# Altium footprint library Connectors.PcbLib: 69 footprints (part 3 of 5)
Each footprint in its own frame and in the unit in brackets; x right, y up, seen from the top. Pads: shape width x height; smd on the part's side, far side on the other; paste and mask are expansions set on the pad; w line width, h text height; cw(c..) or ccw(c..) is an arc to the next point about the centre after c.
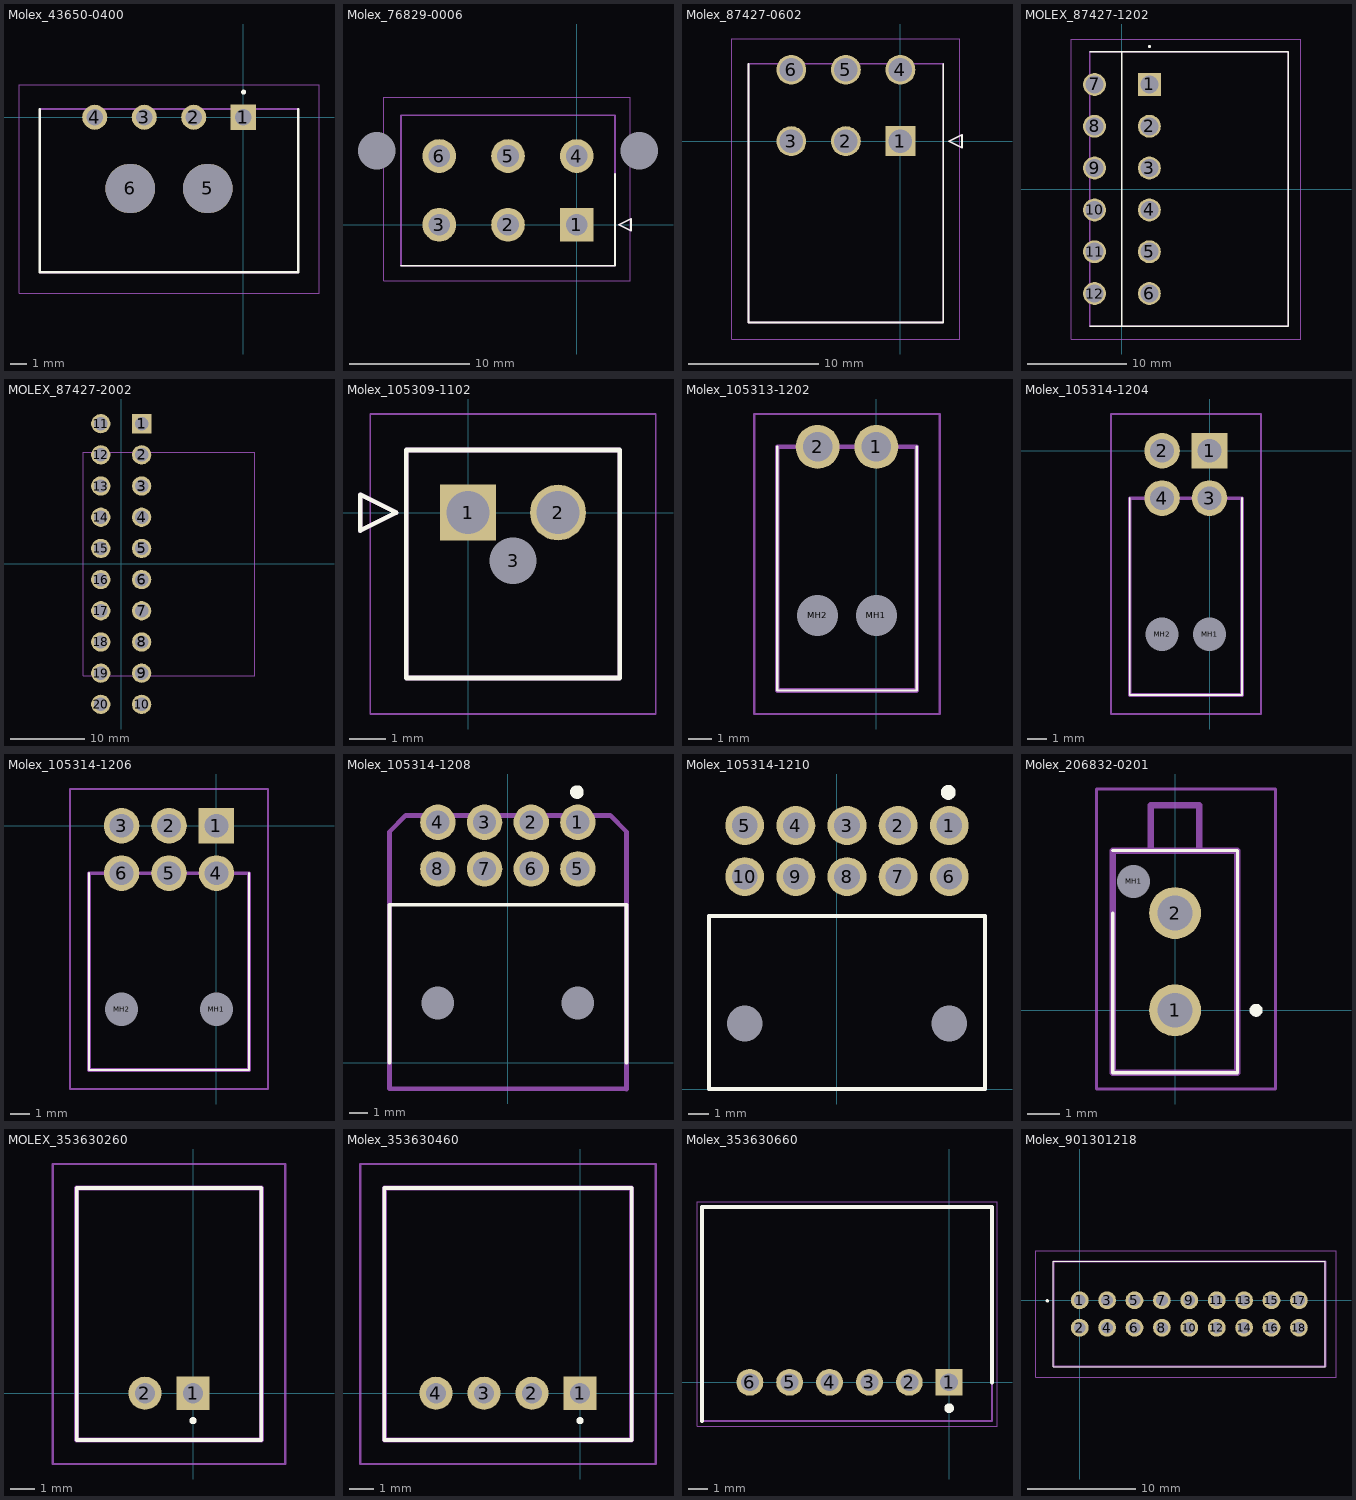
[diagram p2: the footprints below, top view; thin cyan lines are the x and y axes]

## Molex_43650-0400 [mm]
pads (6):
  rect 1.52x1.52 hole 1.02: 1(0,0)
  round 1.52 hole 1.02: 2(-3,0) 3(-6,0) 4(-9,0)
  round 3 hole 3 unplated: 5(-2.15,-4.32) 6(-6.85,-4.32)
Top Overlay:
  lines w0.15: -12.325,0.49 -12.325,-9.41 3.325,-9.41 3.325,0.49
  lines w0.2: 0.025,1.474 ccw(c0.025,1.524) 0.025,1.574 ccw(c0.025,1.524) 0.025,1.474
Top 3D Body (Mech13):
  lines w0.127: -12.325,-9.41 3.325,-9.41 3.325,0.49 -12.325,0.49 -12.325,-9.41
Mechanical 15:
  lines w0.05: -13.595,-10.68 4.595,-10.68 4.595,1.979 -13.595,1.979 -13.595,-10.68
3D body "43650-0400.stp": height 5.55, standoff -3.36, extent -12.375,-9.01 3.275,0.89

## Molex_76829-0006 [mm]
pads (8):
  round 0 hole 3.1 unplated: 0(-16.59,6.15) 0(5.19,6.15)
  rect 2.8x2.8 hole 1.8: 1(0,0)
  round 2.8 hole 1.8: 2(-5.7,0) 3(-11.4,0) 4(0,5.7) 5(-5.7,5.7) 6(-11.4,5.7)
Top Overlay:
  lines w0.127: -14.575,-3.39 3.175,-3.39 3.175,4.22 ; 3.5,0 4.5,-0.5 4.5,0.5 3.5,0
Top 3D Body (Mech13):
  lines w0.127: -14.575,-3.39 3.175,-3.39 3.175,9.09 -14.575,9.09 -14.575,-3.39 ; 3.5,0 4.5,-0.5 4.5,0.5 3.5,0
Mechanical 15:
  lines w0.05: -15.999,-4.66 4.445,-4.66 4.445,10.589 -15.999,10.589 -15.999,-4.66
3D body "768290006.stp": height 14.83, standoff -3.75, extent -18.141,-3.199 6.651,10.835

## Molex_87427-0602 [mm]
pads (6):
  rect 2.3x2.3 hole 1.8: 1(0,0)
  round 2.3 hole 1.8: 2(-4.2,0) 3(-8.4,0) 4(0,5.5) 5(-4.2,5.5) 6(-8.4,5.5)
Top Overlay:
  lines w0.127: -11.7,5.968 -11.7,-13.968 3.3,-13.968 3.3,5.968 ; 3.75,0 4.75,0.5 4.75,-0.5 3.75,0
Top 3D Body (Mech13):
  lines w0.127: -11.7,-13.968 -11.7,5.968 3.3,5.968 3.3,-13.968 -11.7,-13.968 ; 3.75,0 4.75,0.5 4.75,-0.5 3.75,0
Mechanical 15:
  lines w0.05: -12.97,-15.238 -12.97,7.869 4.57,7.869 4.57,-15.238 -12.97,-15.238
3D body "87427-0602.stp": height 11.4, standoff -3.3, extent -11.6,-14 3.4,5.935

## MOLEX_87427-1202 [mm]
pads (12):
  rect 2.3x2.3 hole 1.8: 1(2.75,10.5)
  round 2.3 hole 1.8: 2(2.75,6.3) 3(2.75,2.1) 4(2.75,-2.1) 5(2.75,-6.3) 6(2.75,-10.5) 7(-2.75,10.5) 8(-2.75,6.3) 9(-2.75,2.1) 10(-2.75,-2.1) 11(-2.75,-6.3) 12(-2.75,-10.5)
Top Overlay:
  lines w0.15: -3.218,-13.8 16.718,-13.8 16.718,13.8 -3.218,13.8 ; 0,-13.75 0,13.75
  lines w0.2: 2.775,14.26 ccw(c2.775,14.31) 2.775,14.36 ccw(c2.775,14.31) 2.775,14.26
Top 3D Body (Mech13):
  lines w0.127: -3.218,-13.8 16.718,-13.8 16.718,13.8 -3.218,13.8 -3.218,-13.8
Mechanical 15:
  lines w0.05: -5.119,-15.07 17.988,-15.07 17.988,15.07 -5.119,15.07 -5.119,-15.07
3D body "87427-1202.stp": height 11.4, standoff -3.3, extent -3.415,-13.84 16.52,13.76

## MOLEX_87427-2002 [mm]
pads (20):
  rect 2.6x2.6 hole 1.8: 1(2.75,18.9)
  round 2.6 hole 1.8: 2(2.75,14.7) 3(2.75,10.5) 4(2.75,6.3) 5(2.75,2.1) 6(2.75,-2.1) 7(2.75,-6.3) 8(2.75,-10.5) 9(2.75,-14.7) 10(2.75,-18.9) 11(-2.75,18.9) 12(-2.75,14.7) 13(-2.75,10.5) 14(-2.75,6.3) 15(-2.75,2.1) 16(-2.75,-2.1) 17(-2.75,-6.3) 18(-2.75,-10.5) 19(-2.75,-14.7) 20(-2.75,-18.9)
Top Overlay:
  lines w0.2: 2.775,14.26 cw(c2.775,14.31) 2.775,14.36 cw(c2.775,14.31) 2.775,14.26
Mechanical 15:
  lines w0.05: -5.119,-15.07 -5.119,15.07 17.988,15.07 17.988,-15.07 -5.119,-15.07
3D body "874272002.stp": height 11.4, standoff -3.3, extent -3.415,-22.2 16.52,22.2

## Molex_105309-1102 [mm]
pads (3):
  rect 1.55x1.55 hole 1.2: 1(0,0)
  round 1.55 hole 1.2: 2(2.5,0)
  round 0.65 hole 1.3 unplated: 3(1.25,-1.34)
Top Overlay:
  lines w0.127: -3,-0.5 -2,0 -3,0.5 -3,-0.5 ; -1.72,-4.6 -1.72,1.74 4.22,1.74 4.22,-4.6 -1.72,-4.6
Top 3D Body (Mech13):
  lines w0.127: -3,-0.5 -2,0 -3,0.5 -3,-0.5 ; -1.72,-4.6 -1.72,1.74 4.22,1.74 4.22,-4.6 -1.72,-4.6
Mechanical 15:
  lines w0.05: -2.72,-5.6 -2.72,2.74 5.22,2.74 5.22,-5.6 -2.72,-5.6
3D body "1053091102.stp": height 10.45, standoff -3.26, extent -1.69,-4.6 4.25,1.74

## Molex_105313-1202 [mm]
pads (4):
  round 1.875 hole 1.25: 1(0,-2.5) 2(-2.5,-2.5)
  round 0.875 hole 1.75 unplated: MH1(0,-9.68) MH2(-2.5,-9.68)
Top Overlay:
  lines w0.1: -4.22,-2.5 -4.22,-12.88 1.72,-12.88 ; 1.72,-12.88 1.72,-2.5 1.72,-12.88
Top 3D Body (Mech13):
  lines w0.2: -4.22,-12.88 -4.22,-2.5 ; -4.2,-12.88 1.72,-12.88 1.72,-2.5 -4.2,-2.5
Mechanical 15:
  lines w0.1: -5.2,-13.88 2.7,-13.88 2.7,-1.1 -5.2,-1.1 -5.2,-13.88
3D body "1053131202.stp": height 6.65, standoff -3.19, extent -4.22,-14.29 1.72,-2.133

## Molex_105314-1204 [mm]
pads (6):
  rect 1.875x1.875 hole 1.25: 1(0,0)
  round 1.875 hole 1.25: 2(-2.5,0) 3(0,-2.5) 4(-2.5,-2.5)
  round 0.875 hole 1.75 unplated: MH1(0,-9.68) MH2(-2.5,-9.68)
Top Overlay:
  lines w0.1: -4.204,-2.5 -4.204,-12.88 1.72,-12.88 ; 1.72,-12.88 1.72,-2.5 1.72,-12.88
Top 3D Body (Mech13):
  lines w0.2: -4.204,-12.88 1.72,-12.88 1.72,-2.5 -4.204,-2.5 -4.204,-12.88
Mechanical 15:
  lines w0.1: -5.2,-13.88 2.72,-13.88 2.72,1.938 -5.2,1.938 -5.2,-13.88
3D body "1053141204.stp": height 9.2, standoff -3.14, extent -4.22,-14.39 1.72,0.268

## Molex_105314-1206 [mm]
pads (8):
  rect 1.875x1.875 hole 1.25: 1(0,0)
  round 1.875 hole 1.25: 2(-2.5,0) 3(-5,0) 4(0,-2.5) 5(-2.5,-2.5) 6(-5,-2.5)
  round 0.875 hole 1.75 unplated: MH1(0,-9.68) MH2(-5,-9.68)
Top Overlay:
  lines w0.1: -6.72,-12.88 1.72,-12.88 ; -6.72,-12.88 1.72,-12.88 ; -6.72,-12.88 -6.72,-2.5 -6.72,-12.88 ; 1.72,-12.88 1.72,-2.5 1.72,-12.88
Top 3D Body (Mech13):
  lines w0.2: -6.72,-12.88 -6.72,-2.5 1.72,-2.5 1.72,-12.88 -6.72,-12.88
Mechanical 15:
  lines w0.1: -7.72,-13.88 -7.72,1.938 2.72,1.938 2.72,-13.88 -7.72,-13.88
3D body "105314-1206.stp": height 9.05, standoff -3.29, extent -6.7,-14.23 1.74,0.428

## Molex_105314-1208 [mm]
pads (10):
  round 1.9 hole 1.25: 1(3.75,12.88) 2(1.25,12.88) 3(-1.25,12.88) 4(-3.75,12.88) 5(3.75,10.38) 6(1.25,10.38) 7(-1.25,10.38) 8(-3.75,10.38)
  round 0 hole 1.75 unplated: 9(-3.75,3.2) 10(3.75,3.2)
Top Overlay:
  circle w0.4: c3.7,14.5 r0.164
  lines w0.2: -6.343,0 -6.343,8.46 6.357,8.46 6.357,0
Top 3D Body (Mech13):
  lines w0.25: -6.343,-1.39 -6.343,5.85 -6.343,12.364 -5.46,13.248 5.48,13.248 6.357,12.371 6.357,-1.41 6.347,-1.4 -6.333,-1.4 -6.343,-1.39
3D body "105314-1208.stp": height 9.07, standoff -3.27, extent -5.46,-1.41 5.48,13.248
3D body "1053081208.stp": height 9.41, standoff -0.63, extent -6.343,-9.85 6.357,5.85

## Molex_105314-1210 [mm]
pads (12):
  round 1.9 hole 1.25: 1(5.5,12.88) 2(3,12.88) 3(0.5,12.88) 4(-2,12.88) 5(-4.5,12.88) 6(5.5,10.38) 7(3,10.38) 8(0.5,10.38) 9(-2,10.38) 10(-4.5,10.38)
  round 0 hole 1.75 unplated: 9(-4.5,3.2) 10(5.5,3.2)
Top Overlay:
  circle w0.4: c5.45,14.5 r0.164
  lines w0.2: -6.25,0 -6.25,8.46 7.25,8.46 7.25,0 -6.25,0
Top 3D Body (Mech13):
  lines w0.2: -6.25,0 7.25,0 7.25,8.46 -6.25,8.46 -6.25,0
3D body "1053141210.stp": height 9.2, standoff -3.14, extent -6.22,-1.39 7.22,13.267

## Molex_206832-0201 [mm]
pads (3):
  round 1.6 hole 1.07: 1(0,0) 2(0,3)
  round 0.51 hole 1.02 unplated: MH1(-1.28,3.98)
Top Overlay:
  lines w0.1: -1.925,3 -1.925,-1.93 1.925,-1.93 1.925,4.93 -1.925,4.93
  lines w0.2: 2.5,-0.1 cw(c2.5,0) 2.5,0.1 cw(c2.5,0) 2.5,-0.1
Top 3D Body (Mech13):
  lines w0.2: -1.925,-1.93 1.925,-1.93 1.925,4.93 -1.925,4.93 -1.925,-1.93 ; -0.75,4.93 0.75,4.93 0.75,6.33 -0.75,6.33 -0.75,4.93
Mechanical 15:
  lines w0.1: -2.425,-2.43 3.1,-2.43 3.1,6.83 -2.425,6.83 -2.425,-2.43
3D body "206832-0201.stp": height 9.91, standoff -3.17, extent -1.905,-1.92 1.945,6.34

## MOLEX_353630260 [mm]
pads (2):
  rect 1.381x1.381 hole 0.85: 1(0,0)
  round 1.381 hole 0.85: 2(-2,0)
Top Overlay:
  lines w0.15: -4.85,-1.95 2.85,-1.95 2.85,8.55 -4.85,8.55 -4.85,-1.95
  lines w0.2: 0,-1.193 ccw(c0,-1.143) 0,-1.093 ccw(c0,-1.143) 0,-1.193
Top 3D Body (Mech13):
  lines w0.2: -4.85,-1.95 2.85,-1.95 2.85,8.55 -4.85,8.55 -4.85,-1.95
Mechanical 15:
  lines w0.1: -5.85,-2.95 3.85,-2.95 3.85,9.55 -5.85,9.55 -5.85,-2.95
3D body "353630260.stp": height 5.45, standoff -3.25, extent -4.85,-1.95 2.85,8.55

## Molex_353630460 [mm]
pads (4):
  rect 1.381x1.381 hole 0.85: 1(0,0)
  round 1.381 hole 0.85: 2(-2,0) 3(-4,0) 4(-6,0)
Top Overlay:
  lines w0.15: -8.15,-1.95 -8.15,8.55 2.15,8.55 2.15,-1.95 -8.15,-1.95
  lines w0.2: 0,-1.193 ccw(c0,-1.143) 0,-1.093 ccw(c0,-1.143) 0,-1.193
Top 3D Body (Mech13):
  lines w0.2: -8.15,-1.95 -8.15,8.55 2.15,8.55 2.15,-1.95 -8.15,-1.95
Mechanical 15:
  lines w0.1: -9.15,-2.95 -9.15,9.55 3.15,9.55 3.15,-2.95 -9.15,-2.95
3D body "353630460.stp": height 5.41, standoff -3.29, extent -8.15,-1.88 2.15,8.62

## Molex_353630660 [mm]
pads (6):
  rect 1.35x1.35 hole 0.9: 1(0,0)
  round 1.35 hole 0.9: 2(-2,0) 3(-4,0) 4(-6,0) 5(-8,0) 6(-10,0)
Top Overlay:
  circle w0.254: c0,-1.3 r0.117
  lines w0.2: -12.4,-1.95 -12.4,8.8 2.15,8.8 2.15,0
Top 3D Body (Mech13):
  lines w0.1: -12.4,-1.95 -12.4,8.8 2.15,8.8 2.15,-1.95 -12.4,-1.95
Mechanical 15:
  lines w0.05: -12.65,-2.2 -12.65,9.05 2.4,9.05 2.4,-2.2 -12.65,-2.2
3D body "35363-0660.stp": height 5.5, standoff -3.2, extent -12.27,-1.82 2.03,8.68

## Molex_901301218 [mm]
pads (18):
  round 1.65 hole 1.1: 1(0,0) 2(0,-2.54) 3(2.54,0) 4(2.54,-2.54) 5(5.08,0) 6(5.08,-2.54) 7(7.62,0) 8(7.62,-2.54) 9(10.16,0) 10(10.16,-2.54) 11(12.7,0) 12(12.7,-2.54) 13(15.24,0) 14(15.24,-2.54) 15(17.78,0) 16(17.78,-2.54) 17(20.32,0) 18(20.32,-2.54)
Top Overlay:
  lines w0.1: -2.44,-6.145 22.76,-6.145 22.76,3.605 -2.44,3.605 -2.44,-6.145
  lines w0.2: -3,-0.1 cw(c-3,-0.05) -3,0 ; -3,-0.1 ccw(c-3,-0.05) -3,0 ; -3,-0.1 cw(c-3,-0.05) -3,0
Top 3D Body (Mech13):
  lines w0.2: -2.44,-6.145 22.76,-6.145 22.76,3.605 -2.44,3.605 -2.44,-6.145
Mechanical 15:
  lines w0.1: -4.05,-7.145 23.76,-7.145 23.76,4.605 -4.05,4.605 -4.05,-7.145
3D body "90130-1218.stp": height 10.8, standoff -3, extent -2.42,-6.165 22.78,3.585